# Altium footprint library SMT.PcbLib: 325 footprints (part 21 of 21)
Each footprint in its own frame and in the unit in brackets; x right, y up, seen from the top. Pads: shape width x height; smd on the part's side, far side on the other; paste and mask are expansions set on the pad; w line width, h text height; cw(c..) or ccw(c..) is an arc to the next point about the centre after c.
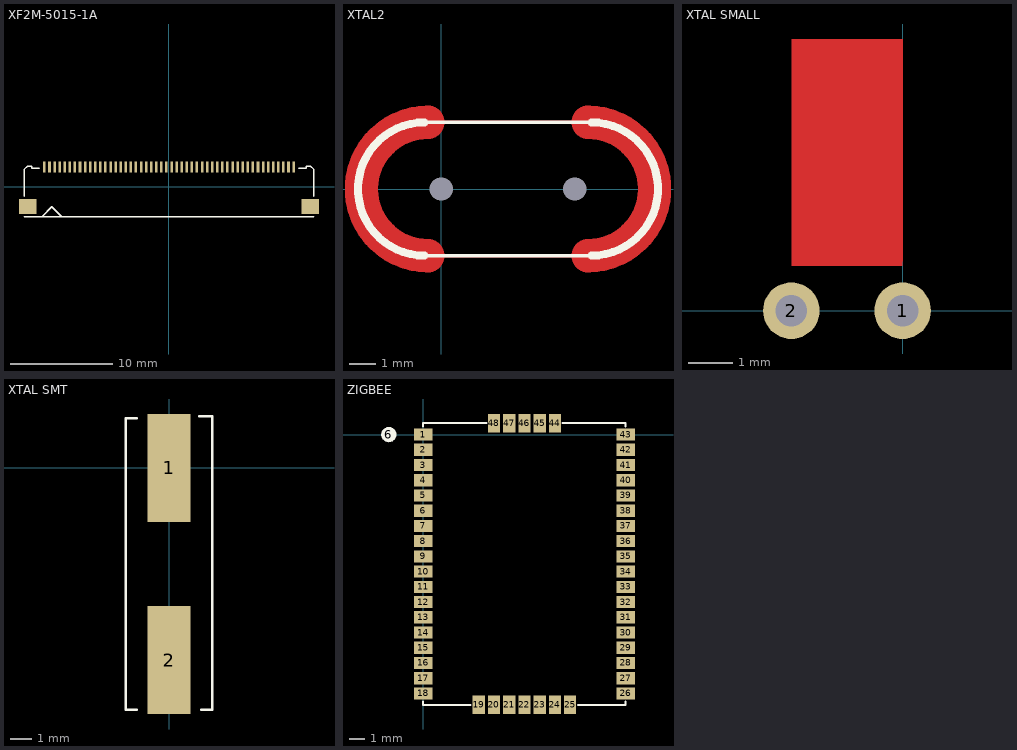
[diagram p20: the footprints below, top view; thin cyan lines are the x and y axes]

## XF2M-5015-1A [mm] "0.5mm Pitch, Dual Contact"
height 3.2
pads (52):
  rect 0.25x1.1 smd: 1(-12.25,1.95) 2(-11.75,1.95) 3(-11.25,1.95) 4(-10.75,1.95) 5(-10.25,1.95) 6(-9.75,1.95) 7(-9.25,1.95) 8(-8.75,1.95) 9(-8.25,1.95) 10(-7.75,1.95) 11(-7.25,1.95) 12(-6.75,1.95) 13(-6.25,1.95) 14(-5.75,1.95) 15(-5.25,1.95) 16(-4.75,1.95) 17(-4.25,1.95) 18(-3.75,1.95) 19(-3.25,1.95) 20(-2.75,1.95) 21(-2.25,1.95) 22(-1.75,1.95) 23(-1.25,1.95) 24(-0.75,1.95) 25(-0.25,1.95) 26(0.25,1.95) 27(0.75,1.95) 28(1.25,1.95) 29(1.75,1.95) 30(2.25,1.95) 31(2.75,1.95) 32(3.25,1.95) 33(3.75,1.95) 34(4.25,1.95) 35(4.75,1.95) 36(5.25,1.95) 37(5.75,1.95) 38(6.25,1.95) 39(6.75,1.95) 40(7.25,1.95) 41(7.75,1.95) 42(8.25,1.95) 43(8.75,1.95) 44(9.25,1.95) 45(9.75,1.95) 46(10.25,1.95) 47(10.75,1.95) 48(11.25,1.95) 49(11.75,1.95) 50(12.25,1.95)
  rect 1.7x1.5 smd: ""(-13.9,-1.95) ""(13.9,-1.95)
TopOverlay:
  lines w0.152: -14.25,-2.95 0,-2.95 14.25,-2.95 ; -14.25,-0.925 -14.25,1.7 -13.95,2 -13.5,2 -13.5,1.825 -12.75,1.825 ; -12.5,-2.95 -11.525,-1.975 -10.55,-2.95 ; 12.75,1.825 13.5,1.825 13.5,2 13.95,2 14.25,1.7 14.25,-0.925

## XTAL2 [mil]
pads (2):
  round 0 hole 35: 1(0,0) 2(200,0)
TopLayer:
  lines w5: -20,-100 220,-100 ; -20,100 220,100
  lines w50: -20,-100 cw(c-20,0) -20,100 ; 220,-100 ccw(c220,0) 220,100
TopOverlay:
  lines w5: -25,-100 225,-100 ; -25,100 225,100
  lines w12: -25,-100 cw(c-25,0) -25,100 ; 225,-100 ccw(c225,0) 225,100
TopSolder:
  lines w5: -20,-100 220,-100 ; -20,100 220,100
  lines w50: -20,-100 cw(c-20,0) -20,100 ; 220,-100 ccw(c220,0) 220,100

## XTAL SMALL [mil]
pads (2):
  round 50 hole 28: 1(0,0) 2(-98.42,0)
TopLayer:
  region: 0,43.31 -98.42,43.31 -98.42,39.37 0,39.37
  region: 0,240.16 0,240.16 0,43.31 0,43.31
  region: -0.02,240.14 -98.44,240.14 -98.44,39.35 -0.02,39.35

## XTAL SMT [mm]
pads (2):
  rect 2x5 smd: 1(0,0) 2(0,-8.9)
TopOverlay:
  lines w0.127: -1.5,-11.2 -2,-11.2 -2,2.3 -1.5,2.3 ; 1.4,2.4 2,2.4 2,-11.2 1.5,-11.2

## ZIGBEE [mm]
pads (49):
  rect 1.2x0.8 smd: 1(0,0) 2(0,-1) 3(0,-2) 4(0,-3) 5(0,-4) 6(0,-5) 7(0,-6) 8(0,-7) 9(0,-8) 10(0,-9) 11(0,-10) 12(0,-11) 13(0,-12) 14(0,-13) 15(0,-14) 16(0,-15) 17(0,-16) 18(0,-17) 26(13.3,-17) 27(13.3,-16) 28(13.3,-15) 29(13.3,-14) 30(13.3,-13) 31(13.3,-12) 32(13.3,-11) 33(13.3,-10) 34(13.3,-9) 35(13.3,-8) 36(13.3,-7) 37(13.3,-6) 38(13.3,-5) 39(13.3,-4) 40(13.3,-3) 41(13.3,-2) 42(13.3,-1) 43(13.3,0)
  round 1.016 on Top Overlay: 6(-2.25,0)
  rect 0.8x1.2 smd: 19(3.65,-17.75) 20(4.65,-17.75) 21(5.65,-17.75) 22(6.65,-17.75) 23(7.65,-17.75) 24(8.65,-17.75) 25(9.65,-17.75) 44(8.65,0.75) 45(7.65,0.75) 46(6.65,0.75) 47(5.65,0.75) 48(4.65,0.75)
TopOverlay:
  lines w0.127: 0,-17.525 0,-17.75 3.125,-17.75 ; 0,0.525 0,0.75 4.15,0.75 ; 9.15,0.75 13.3,0.75 13.3,0.525 ; 10.175,-17.75 13.3,-17.75 13.3,-17.525